# Altium integrated library WE_WR-MPC3_Micro Power Connector_3.00 mm_rev15c.IntLib: 173 symbols (part 1 of 2)
Pins are listed as number, name and electrical type; pins without a type are passive.

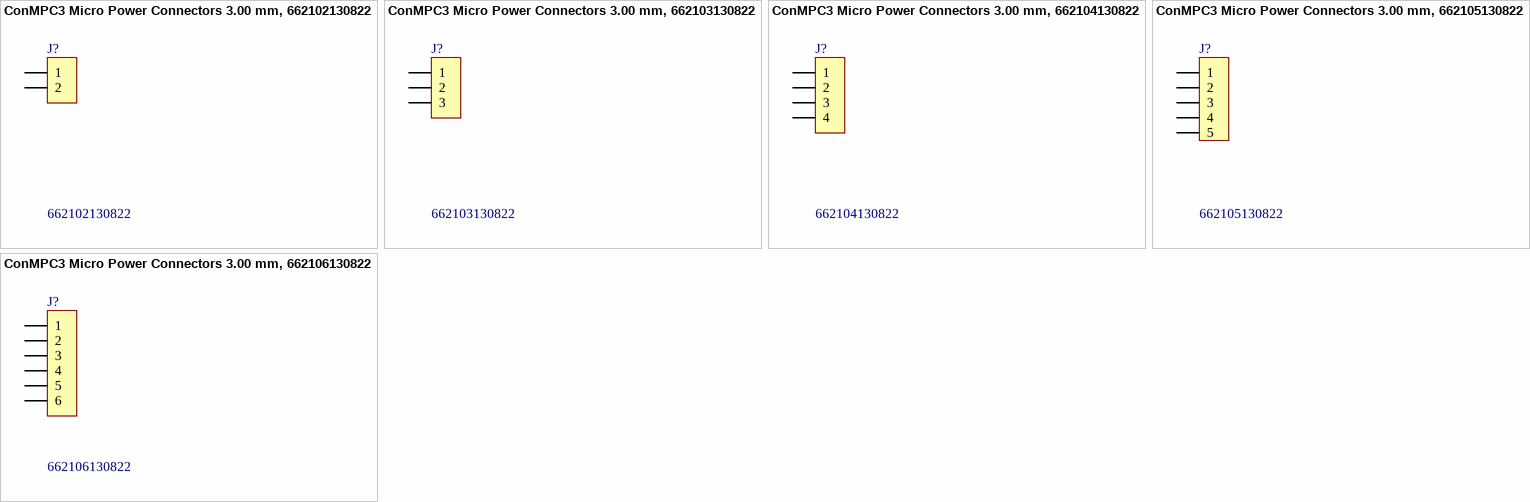
[diagram p0: symbols ConMPC3 Micro Power Connectors 3.00 mm, 662102130822 to ConMPC3 Micro Power Connectors 3.00 mm, 662106130822]

## ConMPC3 Micro Power Connectors 3.00 mm, 662102130822
designator J?, comment 662102130822
SMT Single Row Male Right Angled Header with Through Hole Retention Clips, 2 pins - Tape & Reel; Manufacturer: Wurth Elektronik; ComponentLink1 Description: Manufacturer; ComponentLink2 Description: Datasheet; NoPins: 2; Created Date: 27.Oct.2015; partNo: 662102130822; ComponentLink1URL: http://www.we-online.com; Created by: Baojun Chen
footprint 662102130822 (ConMPC3 Micro Power Connectors 3.00 mm _ 2 pins)
pins: 1, 2

## ConMPC3 Micro Power Connectors 3.00 mm, 662103130822
designator J?, comment 662103130822
SMT Single Row Male Right Angled Header with Through Hole Retention Clips, 3 pins - Tape & Reel; Manufacturer: Wurth Elektronik; ComponentLink1 Description: Manufacturer; ComponentLink2 Description: Datasheet; NoPins: 3; Created Date: 27.Oct.2015; partNo: 662103130822; ComponentLink1URL: http://www.we-online.com; Created by: Baojun Chen
footprint 662103130822 (ConMPC3 Micro Power Connectors 3.00 mm _ 3 pins)
pins: 1, 2, 3

## ConMPC3 Micro Power Connectors 3.00 mm, 662104130822
designator J?, comment 662104130822
SMT Single Row Male Right Angled Header with Through Hole Retention Clips, 4 pins - Tape & Reel; Manufacturer: Wurth Elektronik; ComponentLink1 Description: Manufacturer; ComponentLink2 Description: Datasheet; NoPins: 4; Created Date: 27.Oct.2015; partNo: 662104130822; ComponentLink1URL: http://www.we-online.com; Created by: Baojun Chen
footprint 662104130822 (ConMPC3 Micro Power Connectors 3.00 mm _ 4 pins)
pins: 1, 2, 3, 4

## ConMPC3 Micro Power Connectors 3.00 mm, 662105130822
designator J?, comment 662105130822
SMT Single Row Male Right Angled Header with Through Hole Retention Clips, 5 pins - Tape & Reel; Manufacturer: Wurth Elektronik; ComponentLink1 Description: Manufacturer; ComponentLink2 Description: Datasheet; NoPins: 5; Created Date: 27.Oct.2015; partNo: 662105130822; ComponentLink1URL: http://www.we-online.com; Created by: Baojun Chen
footprint 662105130822 (ConMPC3 Micro Power Connectors 3.00 mm _ 5 pins)
pins: 1, 2, 3, 4, 5

## ConMPC3 Micro Power Connectors 3.00 mm, 662106130822
designator J?, comment 662106130822
SMT Single Row Male Right Angled Header with Through Hole Retention Clips, 6 pins - Tape & Reel; Manufacturer: Wurth Elektronik; ComponentLink1 Description: Manufacturer; ComponentLink2 Description: Datasheet; NoPins: 6; Created Date: 27.Oct.2015; partNo: 662106130822; ComponentLink1URL: http://www.we-online.com; Created by: Baojun Chen
footprint 662106130822 (ConMPC3 Micro Power Connectors 3.00 mm _ 6 pins)
pins: 1, 2, 3, 4, 5, 6


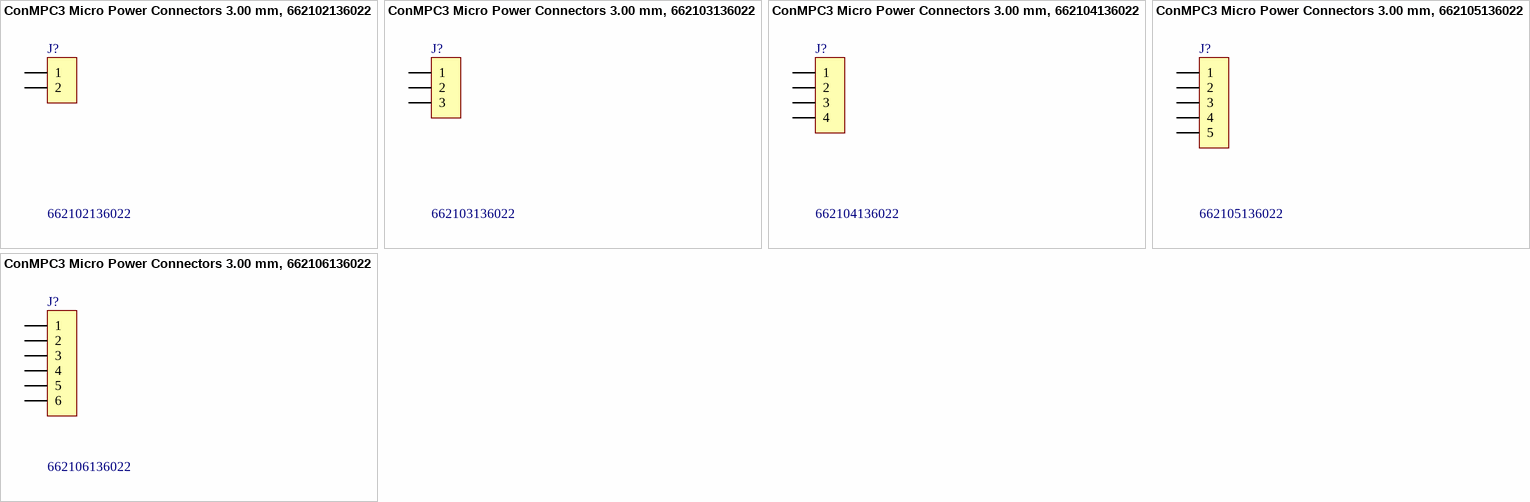
[diagram p1: symbols ConMPC3 Micro Power Connectors 3.00 mm, 662102136022 to ConMPC3 Micro Power Connectors 3.00 mm, 662106136022]

## ConMPC3 Micro Power Connectors 3.00 mm, 662102136022
designator J?, comment 662102136022
SMT Single Row Male Right Angled Header with Snap-in Plastic Pegs, 2 pins - Tape & Reel; Manufacturer: Wurth Elektronik; ComponentLink1 Description: Manufacturer; ComponentLink2 Description: Datasheet; NoPins: 2; Created Date: 27.Oct.2015; partNo: 662102136022; ComponentLink1URL: http://www.we-online.com; Created by: Baojun Chen
footprint 662102136022 (ConMPC3 Micro Power Connectors 3.00 mm _ 2 pins)
pins: 1, 2

## ConMPC3 Micro Power Connectors 3.00 mm, 662103136022
designator J?, comment 662103136022
SMT Single Row Male Right Angled Header with Snap-in Plastic Pegs, 3 pins - Tape & Reel; Manufacturer: Wurth Elektronik; ComponentLink1 Description: Manufacturer; ComponentLink2 Description: Datasheet; NoPins: 3; Created Date: 27.Oct.2015; partNo: 662103136022; ComponentLink1URL: http://www.we-online.com; Created by: Baojun Chen
footprint 662103136022 (ConMPC3 Micro Power Connectors 3.00 mm _ 3 pins)
pins: 1, 2, 3

## ConMPC3 Micro Power Connectors 3.00 mm, 662104136022
designator J?, comment 662104136022
SMT Single Row Male Right Angled Header with Snap-in Plastic Pegs, 4 pins - Tape & Reel; Manufacturer: Wurth Elektronik; ComponentLink1 Description: Manufacturer; ComponentLink2 Description: Datasheet; NoPins: 4; Created Date: 27.Oct.2015; partNo: 662104136022; ComponentLink1URL: http://www.we-online.com; Created by: Baojun Chen
footprint 662104136022 (ConMPC3 Micro Power Connectors 3.00 mm _ 4 pins)
pins: 1, 2, 3, 4

## ConMPC3 Micro Power Connectors 3.00 mm, 662105136022
designator J?, comment 662105136022
SMT Single Row Male Right Angled Header with Snap-in Plastic Pegs, 5 pins - Tape & Reel; Manufacturer: Wurth Elektronik; ComponentLink1 Description: Manufacturer; ComponentLink2 Description: Datasheet; NoPins: 5; Created Date: 27.Oct.2015; partNo: 662105136022; ComponentLink1URL: http://www.we-online.com; Created by: Baojun Chen
footprint 662105136022 (ConMPC3 Micro Power Connectors 3.00 mm _ 5 pins)
pins: 1, 2, 3, 4, 5

## ConMPC3 Micro Power Connectors 3.00 mm, 662106136022
designator J?, comment 662106136022
SMT Single Row Male Right Angled Header with Snap-in Plastic Pegs, 6 pins - Tape & Reel; Manufacturer: Wurth Elektronik; ComponentLink1 Description: Manufacturer; ComponentLink2 Description: Datasheet; NoPins: 6; Created Date: 27.Oct.2015; partNo: 662106136022; ComponentLink1URL: http://www.we-online.com; Created by: Baojun Chen
footprint 662106136022 (ConMPC3 Micro Power Connectors 3.00 mm _ 6 pins)
pins: 1, 2, 3, 4, 5, 6


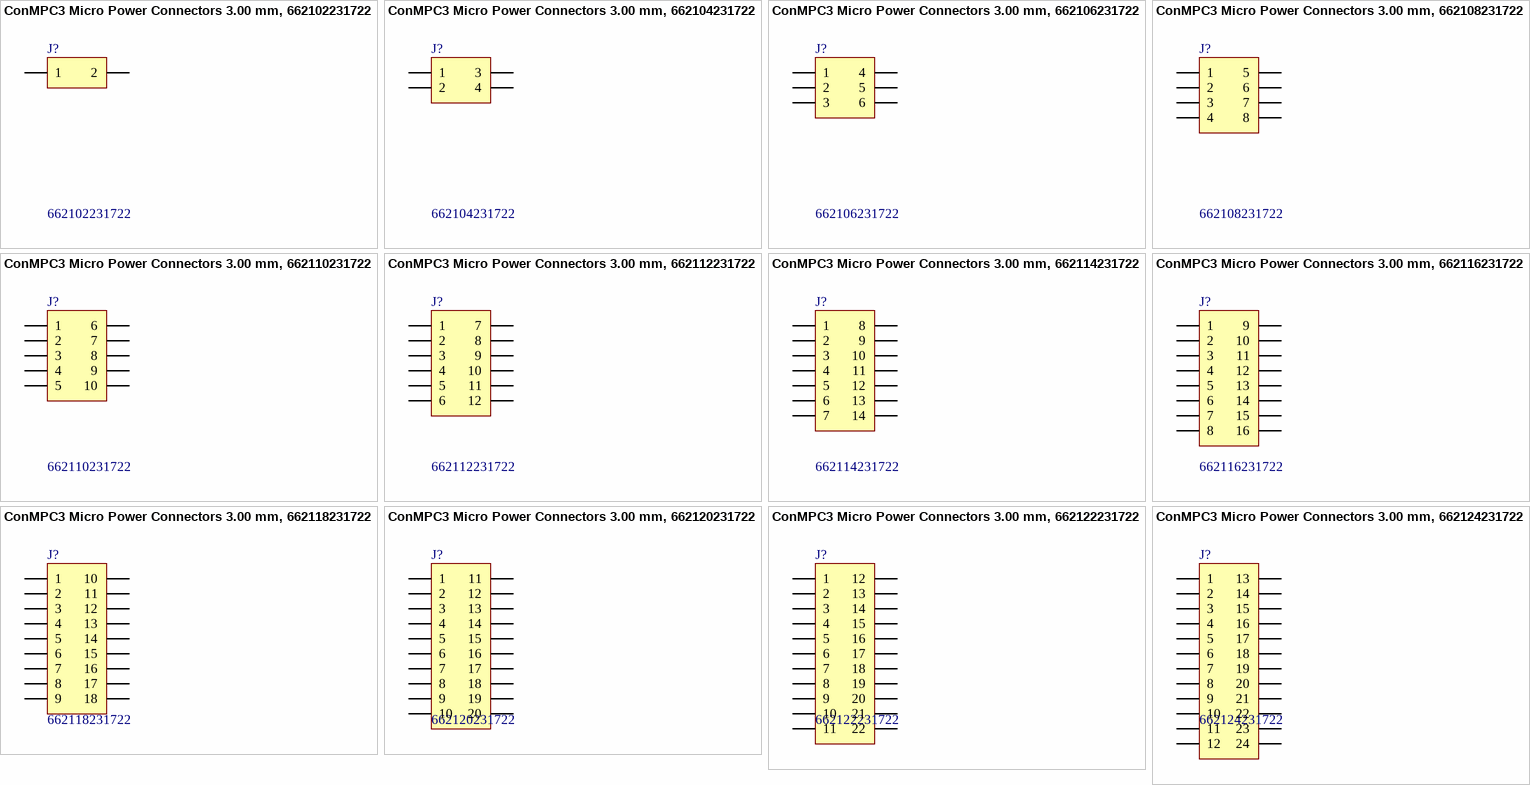
[diagram p2: symbols ConMPC3 Micro Power Connectors 3.00 mm, 662102231722 to ConMPC3 Micro Power Connectors 3.00 mm, 662124231722]

## ConMPC3 Micro Power Connectors 3.00 mm, 662102231722
designator J?, comment 662102231722
WR-MPC3 SMT Dual Row Male Right Angled Header, 2 pins; Manufacturer: Wurth Elektronik; ComponentLink1 Description: Manufacturer; ComponentLink2 Description: Datasheet; NoPins: 2; Created Date: Dec.2015; partNo: 662102231722; ComponentLink1URL: http://www.we-online.com; ComponentLink2URL: http://katalog.we-online.de/em/datasheet/6621xx231722.pdf; Created by: Baojun Chen
footprint 662102231722 (WR-MPC3,SMT Dual Row Male Right Angled Header,2 pins)
pins: 1, 2

## ConMPC3 Micro Power Connectors 3.00 mm, 662104231722
designator J?, comment 662104231722
WR-MPC3 SMT Dual Row Male Right Angled Header, 4 pins; Manufacturer: Wurth Elektronik; ComponentLink1 Description: Manufacturer; ComponentLink2 Description: Datasheet; NoPins: 4; Created Date: Dec.2015; partNo: 662104231722; ComponentLink1URL: http://www.we-online.com; ComponentLink2URL: http://katalog.we-online.de/em/datasheet/6621xx231722.pdf; Created by: Baojun Chen
footprint 662104231722 (WR-MPC3,SMT Dual Row Male Right Angled Header,4 pins)
pins: 1, 2, 3, 4

## ConMPC3 Micro Power Connectors 3.00 mm, 662106231722
designator J?, comment 662106231722
WR-MPC3 SMT Dual Row Male Right Angled Header, 6 pins; Manufacturer: Wurth Elektronik; ComponentLink1 Description: Manufacturer; ComponentLink2 Description: Datasheet; NoPins: 6; Created Date: Dec.2015; partNo: 662106231722; ComponentLink1URL: http://www.we-online.com; ComponentLink2URL: http://katalog.we-online.de/em/datasheet/6621xx231722.pdf; Created by: Baojun Chen
footprint 662106231722 (WR-MPC3,SMT Dual Row Male Right Angled Header,6 pins)
pins: 1, 2, 3, 4, 5, 6

## ConMPC3 Micro Power Connectors 3.00 mm, 662108231722
designator J?, comment 662108231722
WR-MPC3 SMT Dual Row Male Right Angled Header, 8 pins; Manufacturer: Wurth Elektronik; ComponentLink1 Description: Manufacturer; ComponentLink2 Description: Datasheet; NoPins: 8; Created Date: Dec.2015; partNo: 662108231722; ComponentLink1URL: http://www.we-online.com; ComponentLink2URL: http://katalog.we-online.de/em/datasheet/6621xx231722.pdf; Created by: Baojun Chen
footprint 662108231722 (WR-MPC3,SMT Dual Row Male Right Angled Header,8 pins)
pins: 1, 2, 3, 4, 5, 6, 7, 8

## ConMPC3 Micro Power Connectors 3.00 mm, 662110231722
designator J?, comment 662110231722
WR-MPC3 SMT Dual Row Male Right Angled Header, 10 pins; Manufacturer: Wurth Elektronik; ComponentLink1 Description: Manufacturer; ComponentLink2 Description: Datasheet; NoPins: 10; Created Date: Dec.2015; partNo: 662110231722; ComponentLink1URL: http://www.we-online.com; ComponentLink2URL: http://katalog.we-online.de/em/datasheet/6621xx231722.pdf; Created by: Baojun Chen
footprint 662110231722 (WR-MPC3,SMT Dual Row Male Right Angled Header,10 pins)
pins: 1, 2, 3, 4, 5, 6, 7, 8, 9, 10

## ConMPC3 Micro Power Connectors 3.00 mm, 662112231722
designator J?, comment 662112231722
WR-MPC3 SMT Dual Row Male Right Angled Header, 12 pins; Manufacturer: Wurth Elektronik; ComponentLink1 Description: Manufacturer; ComponentLink2 Description: Datasheet; NoPins: 12; Created Date: Dec.2015; partNo: 662112231722; ComponentLink1URL: http://www.we-online.com; ComponentLink2URL: http://katalog.we-online.de/em/datasheet/6621xx231722.pdf; Created by: Baojun Chen
footprint 662112231722 (WR-MPC3,SMT Dual Row Male Right Angled Header,12 pins)
pins: 1, 2, 3, 4, 5, 6, 7, 8, 9, 10, 11, 12

## ConMPC3 Micro Power Connectors 3.00 mm, 662114231722
designator J?, comment 662114231722
WR-MPC3 SMT Dual Row Male Right Angled Header, 14 pins; Manufacturer: Wurth Elektronik; ComponentLink1 Description: Manufacturer; ComponentLink2 Description: Datasheet; NoPins: 14; Created Date: Dec.2015; partNo: 662114231722; ComponentLink1URL: http://www.we-online.com; ComponentLink2URL: http://katalog.we-online.de/em/datasheet/6621xx231722.pdf; Created by: Baojun Chen
footprint 662114231722 (WR-MPC3,SMT Dual Row Male Right Angled Header,14 pins)
pins: 1, 2, 3, 4, 5, 6, 7, 8, 9, 10, 11, 12, 13, 14

## ConMPC3 Micro Power Connectors 3.00 mm, 662116231722
designator J?, comment 662116231722
WR-MPC3 SMT Dual Row Male Right Angled Header, 16 pins; Manufacturer: Wurth Elektronik; ComponentLink1 Description: Manufacturer; ComponentLink2 Description: Datasheet; NoPins: 16; Created Date: Dec.2015; partNo: 662116231722; ComponentLink1URL: http://www.we-online.com; ComponentLink2URL: http://katalog.we-online.de/em/datasheet/6621xx231722.pdf; Created by: Baojun Chen
footprint 662116231722 (WR-MPC3,SMT Dual Row Male Right Angled Header,16 pins)
pins: 1, 2, 3, 4, 5, 6, 7, 8, 9, 10, 11, 12, 13, 14, 15, 16

## ConMPC3 Micro Power Connectors 3.00 mm, 662118231722
designator J?, comment 662118231722
WR-MPC3 SMT Dual Row Male Right Angled Header, 18 pins; Manufacturer: Wurth Elektronik; ComponentLink1 Description: Manufacturer; ComponentLink2 Description: Datasheet; NoPins: 18; Created Date: Dec.2015; partNo: 662118231722; ComponentLink1URL: http://www.we-online.com; ComponentLink2URL: http://katalog.we-online.de/em/datasheet/6621xx231722.pdf; Created by: Baojun Chen
footprint 662118231722 (WR-MPC3,SMT Dual Row Male Right Angled Header,18 pins)
pins: 1, 2, 3, 4, 5, 6, 7, 8, 9, 10, 11, 12, 13, 14, 15, 16, 17, 18

## ConMPC3 Micro Power Connectors 3.00 mm, 662120231722
designator J?, comment 662120231722
WR-MPC3 SMT Dual Row Male Right Angled Header, 20 pins; Manufacturer: Wurth Elektronik; ComponentLink1 Description: Manufacturer; ComponentLink2 Description: Datasheet; NoPins: 20; Created Date: Dec.2015; partNo: 662120231722; ComponentLink1URL: http://www.we-online.com; ComponentLink2URL: http://katalog.we-online.de/em/datasheet/6621xx231722.pdf; Created by: Baojun Chen
footprint 662120231722 (WR-MPC3,SMT Dual Row Male Right Angled Header,20 pins)
pins: 1, 2, 3, 4, 5, 6, 7, 8, 9, 10, 11, 12, 13, 14, 15, 16, 17, 18, 19, 20

## ConMPC3 Micro Power Connectors 3.00 mm, 662122231722
designator J?, comment 662122231722
WR-MPC3 SMT Dual Row Male Right Angled Header, 22 pins; Manufacturer: Wurth Elektronik; ComponentLink1 Description: Manufacturer; ComponentLink2 Description: Datasheet; NoPins: 22; Created Date: Dec.2015; partNo: 662122231722; ComponentLink1URL: http://www.we-online.com; ComponentLink2URL: http://katalog.we-online.de/em/datasheet/6621xx231722.pdf; Created by: Baojun Chen
footprint 662122231722 (WR-MPC3,SMT Dual Row Male Right Angled Header,22 pins)
pins: 1, 2, 3, 4, 5, 6, 7, 8, 9, 10, 11, 12, 13, 14, 15, 16, 17, 18, 19, 20, 21, 22

## ConMPC3 Micro Power Connectors 3.00 mm, 662124231722
designator J?, comment 662124231722
WR-MPC3 SMT Dual Row Male Right Angled Header, 24 pins; Manufacturer: Wurth Elektronik; ComponentLink1 Description: Manufacturer; ComponentLink2 Description: Datasheet; NoPins: 24; Created Date: Dec.2015; partNo: 662124231722; ComponentLink1URL: http://www.we-online.com; ComponentLink2URL: http://katalog.we-online.de/em/datasheet/6621xx231722.pdf; Created by: Baojun Chen
footprint 662124231722 (WR-MPC3,SMT Dual Row Male Right Angled Header,24 pins)
pins: 1, 2, 3, 4, 5, 6, 7, 8, 9, 10, 11, 12, 13, 14, 15, 16, 17, 18, 19, 20, 21, 22, 23, 24


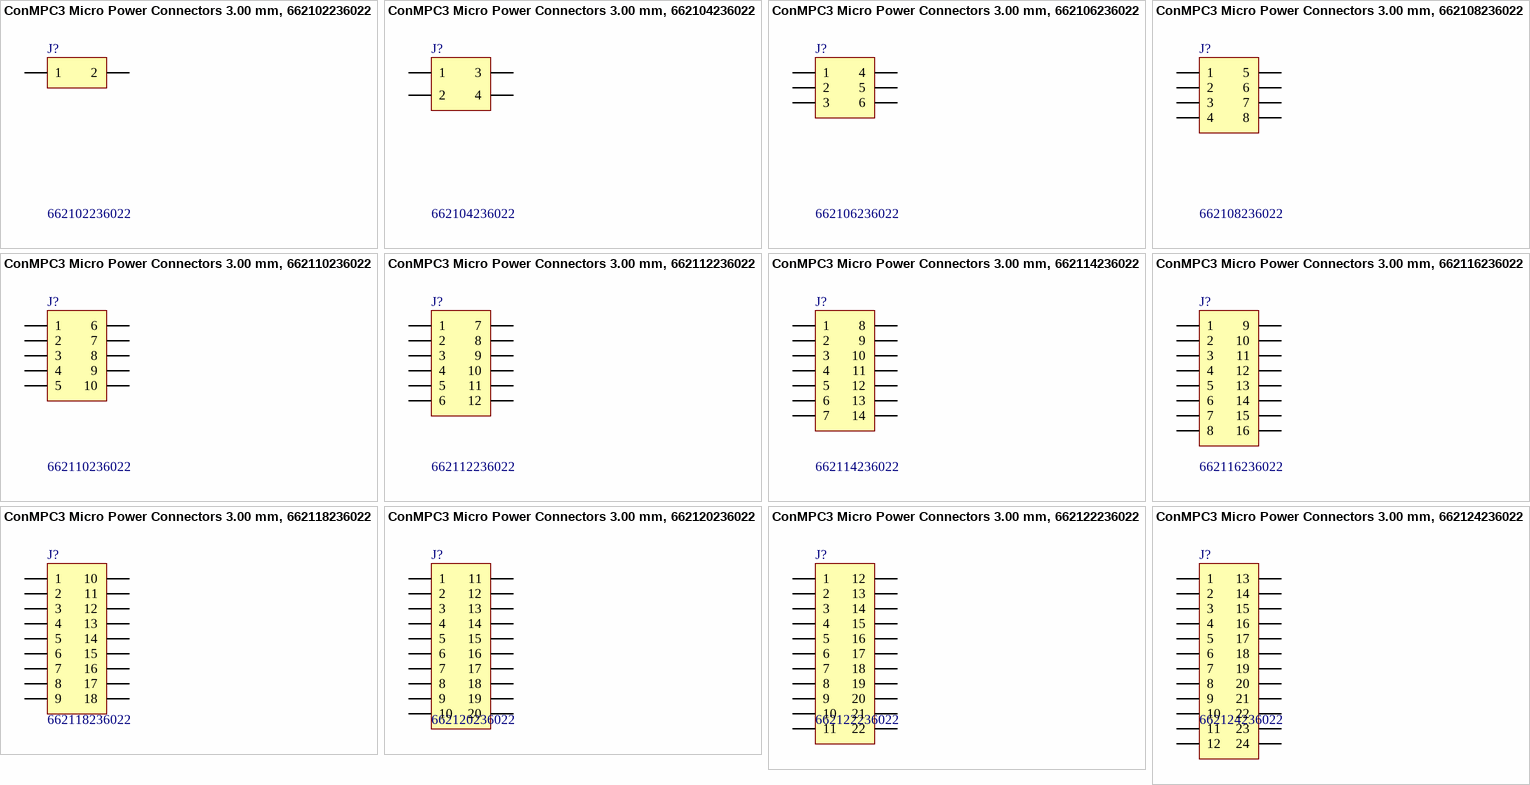
[diagram p3: symbols ConMPC3 Micro Power Connectors 3.00 mm, 662102236022 to ConMPC3 Micro Power Connectors 3.00 mm, 662124236022]

## ConMPC3 Micro Power Connectors 3.00 mm, 662102236022
designator J?, comment 662102236022
WR-MPC3 SMT Dual Row Male Right Angled Header, 2 pins; Manufacturer: Wurth Elektronik; ComponentLink1 Description: Manufacturer; ComponentLink2 Description: Datasheet; NoPins: 2; Created Date: Dec.2015; partNo: 662102236022; ComponentLink1URL: http://www.we-online.com; ComponentLink2URL: http://katalog.we-online.de/em/datasheet/6620xx236022.pdf; Created by: Baojun Chen
footprint 662102236022 (SMT Dual Row Male Right Angled Header, 2 pins)
pins: 1, 2

## ConMPC3 Micro Power Connectors 3.00 mm, 662104236022
designator J?, comment 662104236022
WR-MPC3 SMT Dual Row Male Right Angled Header, 4 pins; Manufacturer: Wurth Elektronik; ComponentLink1 Description: Manufacturer; ComponentLink2 Description: Datasheet; NoPins: 4; Created Date: Dec.2015; partNo: 662104236022; ComponentLink1URL: http://www.we-online.com; ComponentLink2URL: http://katalog.we-online.de/em/datasheet/6620xx236022.pdf; Created by: Baojun Chen
footprint 662104236022 (SMT Dual Row Male Right Angled Header, 4 pins)
pins: 1, 2, 3, 4

## ConMPC3 Micro Power Connectors 3.00 mm, 662106236022
designator J?, comment 662106236022
WR-MPC3 SMT Dual Row Male Right Angled Header, 6 pins; Manufacturer: Wurth Elektronik; ComponentLink1 Description: Manufacturer; ComponentLink2 Description: Datasheet; NoPins: 6; Created Date: Dec.2015; partNo: 662106236022; ComponentLink1URL: http://www.we-online.com; ComponentLink2URL: http://katalog.we-online.de/em/datasheet/6620xx236022.pdf; Created by: Baojun Chen
footprint 662106236022 (SMT Dual Row Male Right Angled Header, 6 pins)
pins: 1, 2, 3, 4, 5, 6

## ConMPC3 Micro Power Connectors 3.00 mm, 662108236022
designator J?, comment 662108236022
WR-MPC3 SMT Dual Row Male Right Angled Header, 8 pins; Manufacturer: Wurth Elektronik; ComponentLink1 Description: Manufacturer; ComponentLink2 Description: Datasheet; NoPins: 8; Created Date: Dec.2015; partNo: 662108236022; ComponentLink1URL: http://www.we-online.com; ComponentLink2URL: http://katalog.we-online.de/em/datasheet/6620xx236022.pdf; Created by: Baojun Chen
footprint 662108236022 (SMT Dual Row Male Right Angled Header, 8 pins)
pins: 1, 2, 3, 4, 5, 6, 7, 8

## ConMPC3 Micro Power Connectors 3.00 mm, 662110236022
designator J?, comment 662110236022
WR-MPC3 SMT Dual Row Male Right Angled Header, 10 pins; Manufacturer: Wurth Elektronik; ComponentLink1 Description: Manufacturer; ComponentLink2 Description: Datasheet; NoPins: 10; Created Date: Dec.2015; partNo: 662110236022; ComponentLink1URL: http://www.we-online.com; ComponentLink2URL: http://katalog.we-online.de/em/datasheet/6620xx236022.pdf; Created by: Baojun Chen
footprint 662110236022 (SMT Dual Row Male Right Angled Header, 10 pins)
pins: 1, 2, 3, 4, 5, 6, 7, 8, 9, 10

## ConMPC3 Micro Power Connectors 3.00 mm, 662112236022
designator J?, comment 662112236022
WR-MPC3 SMT Dual Row Male Right Angled Header, 12 pins; Manufacturer: Wurth Elektronik; ComponentLink1 Description: Manufacturer; ComponentLink2 Description: Datasheet; NoPins: 12; Created Date: Dec.2015; partNo: 662112236022; ComponentLink1URL: http://www.we-online.com; ComponentLink2URL: http://katalog.we-online.de/em/datasheet/6620xx236022.pdf; Created by: Baojun Chen
footprint 662112236022 (SMT Dual Row Male Right Angled Header, 12 pins)
pins: 1, 2, 3, 4, 5, 6, 7, 8, 9, 10, 11, 12

## ConMPC3 Micro Power Connectors 3.00 mm, 662114236022
designator J?, comment 662114236022
WR-MPC3 SMT Dual Row Male Right Angled Header, 14 pins; Manufacturer: Wurth Elektronik; ComponentLink1 Description: Manufacturer; ComponentLink2 Description: Datasheet; NoPins: 14; Created Date: Dec.2015; partNo: 662114236022; ComponentLink1URL: http://www.we-online.com; ComponentLink2URL: http://katalog.we-online.de/em/datasheet/6620xx236022.pdf; Created by: Baojun Chen
footprint 662114236022 (SMT Dual Row Male Right Angled Header, 14 pins)
pins: 1, 2, 3, 4, 5, 6, 7, 8, 9, 10, 11, 12, 13, 14

## ConMPC3 Micro Power Connectors 3.00 mm, 662116236022
designator J?, comment 662116236022
WR-MPC3 SMT Dual Row Male Right Angled Header, 16 pins; Manufacturer: Wurth Elektronik; ComponentLink1 Description: Manufacturer; ComponentLink2 Description: Datasheet; NoPins: 16; Created Date: Dec.2015; partNo: 662116236022; ComponentLink1URL: http://www.we-online.com; ComponentLink2URL: http://katalog.we-online.de/em/datasheet/6620xx236022.pdf; Created by: Baojun Chen
footprint 662116236022 (SMT Dual Row Male Right Angled Header, 16 pins)
pins: 1, 2, 3, 4, 5, 6, 7, 8, 9, 10, 11, 12, 13, 14, 15, 16

## ConMPC3 Micro Power Connectors 3.00 mm, 662118236022
designator J?, comment 662118236022
WR-MPC3 SMT Dual Row Male Right Angled Header, 18 pins; Manufacturer: Wurth Elektronik; ComponentLink1 Description: Manufacturer; ComponentLink2 Description: Datasheet; NoPins: 18; Created Date: Dec.2015; partNo: 662118236022; ComponentLink1URL: http://www.we-online.com; ComponentLink2URL: http://katalog.we-online.de/em/datasheet/6620xx236022.pdf; Created by: Baojun Chen
footprint 662118236022 (SMT Dual Row Male Right Angled Header, 18 pins)
pins: 1, 2, 3, 4, 5, 6, 7, 8, 9, 10, 11, 12, 13, 14, 15, 16, 17, 18

## ConMPC3 Micro Power Connectors 3.00 mm, 662120236022
designator J?, comment 662120236022
WR-MPC3 SMT Dual Row Male Right Angled Header, 20 pins; Manufacturer: Wurth Elektronik; ComponentLink1 Description: Manufacturer; ComponentLink2 Description: Datasheet; NoPins: 20; Created Date: Dec.2015; partNo: 662120236022; ComponentLink1URL: http://www.we-online.com; ComponentLink2URL: http://katalog.we-online.de/em/datasheet/6620xx236022.pdf; Created by: Baojun Chen
footprint 662120236022 (SMT Dual Row Male Right Angled Header, 20 pins)
pins: 1, 2, 3, 4, 5, 6, 7, 8, 9, 10, 11, 12, 13, 14, 15, 16, 17, 18, 19, 20

## ConMPC3 Micro Power Connectors 3.00 mm, 662122236022
designator J?, comment 662122236022
WR-MPC3 SMT Dual Row Male Right Angled Header, 22 pins; Manufacturer: Wurth Elektronik; ComponentLink1 Description: Manufacturer; ComponentLink2 Description: Datasheet; NoPins: 22; Created Date: Dec.2015; partNo: 662122236022; ComponentLink1URL: http://www.we-online.com; ComponentLink2URL: http://katalog.we-online.de/em/datasheet/6620xx236022.pdf; Created by: Baojun Chen
footprint 662122236022 (SMT Dual Row Male Right Angled Header, 22 pins)
pins: 1, 2, 3, 4, 5, 6, 7, 8, 9, 10, 11, 12, 13, 14, 15, 16, 17, 18, 19, 20, 21, 22

## ConMPC3 Micro Power Connectors 3.00 mm, 662124236022
designator J?, comment 662124236022
WR-MPC3 SMT Dual Row Male Right Angled Header, 24 pins; Manufacturer: Wurth Elektronik; ComponentLink1 Description: Manufacturer; ComponentLink2 Description: Datasheet; NoPins: 24; Created Date: Dec.2015; partNo: 662124236022; ComponentLink1URL: http://www.we-online.com; ComponentLink2URL: http://katalog.we-online.de/em/datasheet/6620xx236022.pdf; Created by: Baojun Chen
footprint 662124236022 (SMT Dual Row Male Right Angled Header, 24 pins)
pins: 1, 2, 3, 4, 5, 6, 7, 8, 9, 10, 11, 12, 13, 14, 15, 16, 17, 18, 19, 20, 21, 22, 23, 24


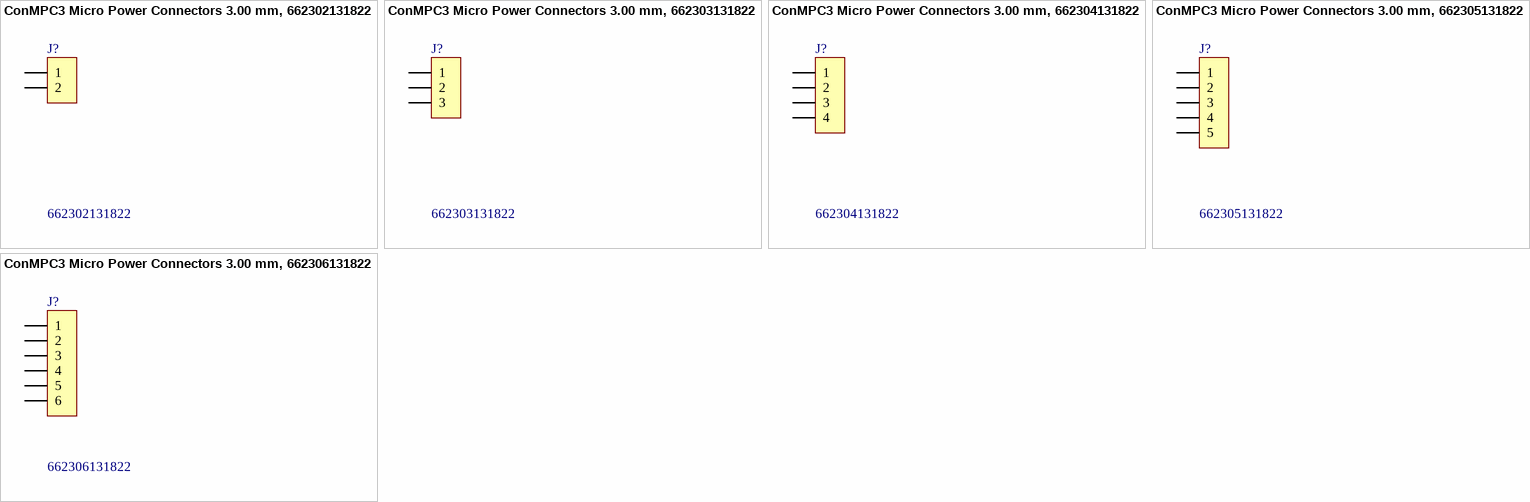
[diagram p4: symbols ConMPC3 Micro Power Connectors 3.00 mm, 662302131822 to ConMPC3 Micro Power Connectors 3.00 mm, 662306131822]

## ConMPC3 Micro Power Connectors 3.00 mm, 662302131822
designator J?, comment 662302131822
SMT Single Row Male Vertical Header with SMT Solder Tabs, 2 pins - Tape & Reel with Cap; Manufacturer: Wurth Elektronik; ComponentLink1 Description: Manufacturer; ComponentLink2 Description: Datasheet; NoPins: 2; Created Date: 27.Oct.2015; partNo: 662302131822; ComponentLink1URL: http://www.we-online.com; Created by: Baojun Chen
footprint 662302131822 (ConMPC3 Micro Power Connectors 3.00 mm _ 2 pins)
pins: 1, 2

## ConMPC3 Micro Power Connectors 3.00 mm, 662303131822
designator J?, comment 662303131822
SMT Single Row Male Vertical Header with SMT Solder Tabs, 3 pins - Tape & Reel with Cap; Manufacturer: Wurth Elektronik; ComponentLink1 Description: Manufacturer; ComponentLink2 Description: Datasheet; NoPins: 3; Created Date: 27.Oct.2015; partNo: 662303131822; ComponentLink1URL: http://www.we-online.com; Created by: Baojun Chen
footprint 662303131822 (ConMPC3 Micro Power Connectors 3.00 mm _ 3 pins)
pins: 1, 2, 3

## ConMPC3 Micro Power Connectors 3.00 mm, 662304131822
designator J?, comment 662304131822
SMT Single Row Male Vertical Header with SMT Solder Tabs, 4 pins - Tape & Reel with Cap; Manufacturer: Wurth Elektronik; ComponentLink1 Description: Manufacturer; ComponentLink2 Description: Datasheet; NoPins: 4; Created Date: 27.Oct.2015; partNo: 662304131822; ComponentLink1URL: http://www.we-online.com; Created by: Baojun Chen
footprint 662304131822 (ConMPC3 Micro Power Connectors 3.00 mm _ 4 pins)
pins: 1, 2, 3, 4

## ConMPC3 Micro Power Connectors 3.00 mm, 662305131822
designator J?, comment 662305131822
SMT Single Row Male Vertical Header with SMT Solder Tabs, 5 pins - Tape & Reel with Cap; Manufacturer: Wurth Elektronik; ComponentLink1 Description: Manufacturer; ComponentLink2 Description: Datasheet; NoPins: 5; Created Date: 27.Oct.2015; partNo: 662305131822; ComponentLink1URL: http://www.we-online.com; Created by: Baojun Chen
footprint 662305131822 (ConMPC3 Micro Power Connectors 3.00 mm _ 5 pins)
pins: 1, 2, 3, 4, 5

## ConMPC3 Micro Power Connectors 3.00 mm, 662306131822
designator J?, comment 662306131822
SMT Single Row Male Vertical Header with SMT Solder Tabs, 6 pins - Tape & Reel with Cap; Manufacturer: Wurth Elektronik; ComponentLink1 Description: Manufacturer; ComponentLink2 Description: Datasheet; NoPins: 6; Created Date: 27.Oct.2015; partNo: 662306131822; ComponentLink1URL: http://www.we-online.com; Created by: Baojun Chen
footprint 662306131822 (ConMPC3 Micro Power Connectors 3.00 mm _ 6 pins)
pins: 1, 2, 3, 4, 5, 6


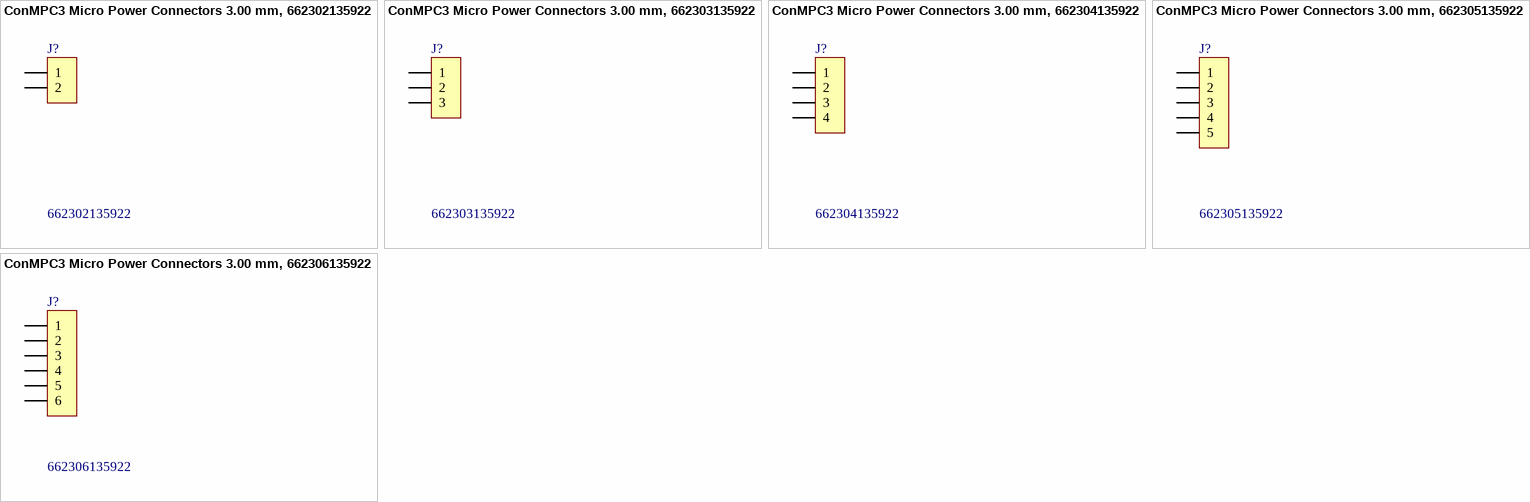
[diagram p5: symbols ConMPC3 Micro Power Connectors 3.00 mm, 662302135922 to ConMPC3 Micro Power Connectors 3.00 mm, 662306135922]

## ConMPC3 Micro Power Connectors 3.00 mm, 662302135922
designator J?, comment 662302135922
SMT Single Row Male Vertical Header with Through Hole Retention Clips, 2 pins - Tape & Reel with Cap; Manufacturer: Wurth Elektronik; ComponentLink1 Description: Manufacturer; ComponentLink2 Description: Datasheet; NoPins: 2; Created Date: 27.Oct.2015; partNo: 662302135922; ComponentLink1URL: http://www.we-online.com; Created by: Baojun Chen
footprint 662302135922 (ConMPC3 Micro Power Connectors 3.00 mm _ 2 pins)
pins: 1, 2

## ConMPC3 Micro Power Connectors 3.00 mm, 662303135922
designator J?, comment 662303135922
SMT Single Row Male Vertical Header with Through Hole Retention Clips, 3 pins - Tape & Reel with Cap; Manufacturer: Wurth Elektronik; ComponentLink1 Description: Manufacturer; ComponentLink2 Description: Datasheet; NoPins: 3; Created Date: 27.Oct.2015; partNo: 662303135922; ComponentLink1URL: http://www.we-online.com; Created by: Baojun Chen
footprint 662303135922 (ConMPC3 Micro Power Connectors 3.00 mm _ 3 pins)
pins: 1, 2, 3

## ConMPC3 Micro Power Connectors 3.00 mm, 662304135922
designator J?, comment 662304135922
SMT Single Row Male Vertical Header with Through Hole Retention Clips, 4 pins - Tape & Reel with Cap; Manufacturer: Wurth Elektronik; ComponentLink1 Description: Manufacturer; ComponentLink2 Description: Datasheet; NoPins: 4; Created Date: 27.Oct.2015; partNo: 662304135922; ComponentLink1URL: http://www.we-online.com; Created by: Baojun Chen
footprint 662304135922 (ConMPC3 Micro Power Connectors 3.00 mm _ 4 pins)
pins: 1, 2, 3, 4

## ConMPC3 Micro Power Connectors 3.00 mm, 662305135922
designator J?, comment 662305135922
SMT Single Row Male Vertical Header with Through Hole Retention Clips, 5 pins - Tape & Reel with Cap; Manufacturer: Wurth Elektronik; ComponentLink1 Description: Manufacturer; ComponentLink2 Description: Datasheet; NoPins: 5; Created Date: 27.Oct.2015; partNo: 662305135922; ComponentLink1URL: http://www.we-online.com; Created by: Baojun Chen
footprint 662305135922 (ConMPC3 Micro Power Connectors 3.00 mm _ 5 pins)
pins: 1, 2, 3, 4, 5

## ConMPC3 Micro Power Connectors 3.00 mm, 662306135922
designator J?, comment 662306135922
SMT Single Row Male Vertical Header with Through Hole Retention Clips, 6 pins - Tape & Reel with Cap; Manufacturer: Wurth Elektronik; ComponentLink1 Description: Manufacturer; ComponentLink2 Description: Datasheet; NoPins: 6; Created Date: 27.Oct.2015; partNo: 662306135922; ComponentLink1URL: http://www.we-online.com; Created by: Baojun Chen
footprint 662306135922 (ConMPC3 Micro Power Connectors 3.00 mm _ 6 pins)
pins: 1, 2, 3, 4, 5, 6


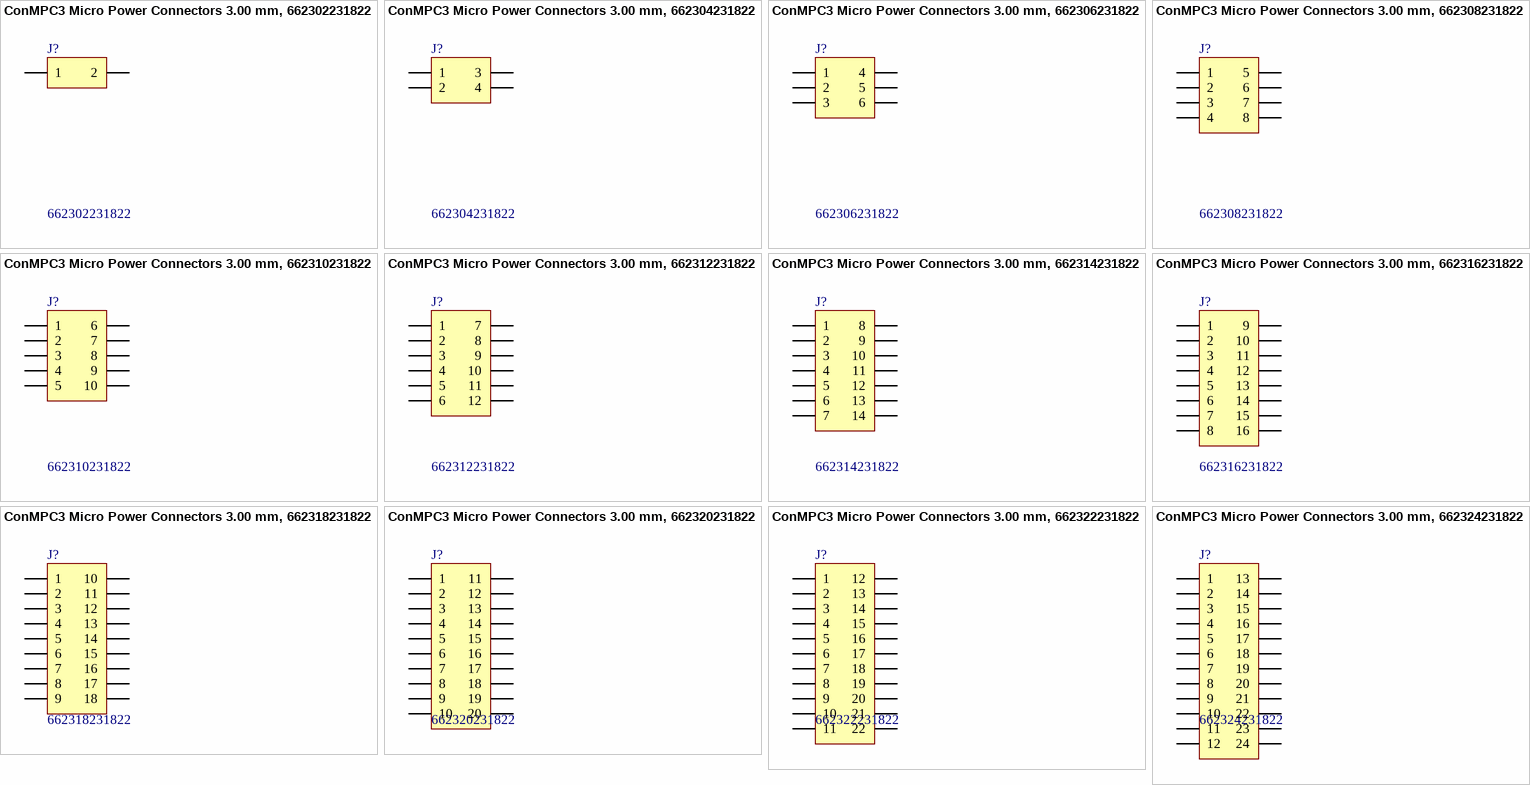
[diagram p6: symbols ConMPC3 Micro Power Connectors 3.00 mm, 662302231822 to ConMPC3 Micro Power Connectors 3.00 mm, 662324231822]

## ConMPC3 Micro Power Connectors 3.00 mm, 662302231822
designator J?, comment 662302231822
WR-MPC3 SMT Dual Row Male Vertical Header, 2 pins; Manufacturer: Wurth Elektronik; ComponentLink1 Description: Manufacturer; ComponentLink2 Description: Datasheet; NoPins: 2; Created Date: Dec.2015; partNo: 662302231822; ComponentLink1URL: http://www.we-online.com; ComponentLink2URL: http://katalog.we-online.de/em/datasheet/6620xx231822.pdf; Created by: Baojun Chen
footprint 662302231822 (SMT Dual Row Male Vertical Header, 2 pins)
pins: 1, 2

## ConMPC3 Micro Power Connectors 3.00 mm, 662304231822
designator J?, comment 662304231822
WR-MPC3 SMT Dual Row Male Vertical Header, 4 pins; Manufacturer: Wurth Elektronik; ComponentLink1 Description: Manufacturer; ComponentLink2 Description: Datasheet; NoPins: 4; Created Date: Dec.2015; partNo: 662304231822; ComponentLink1URL: http://www.we-online.com; ComponentLink2URL: http://katalog.we-online.de/em/datasheet/6620xx231822.pdf; Created by: Baojun Chen
footprint 662304231822 (SMT Dual Row Male Vertical Header, 4 pins)
pins: 1, 2, 3, 4

## ConMPC3 Micro Power Connectors 3.00 mm, 662306231822
designator J?, comment 662306231822
WR-MPC3 SMT Dual Row Male Vertical Header, 6 pins; Manufacturer: Wurth Elektronik; ComponentLink1 Description: Manufacturer; ComponentLink2 Description: Datasheet; NoPins: 6; Created Date: Dec.2015; partNo: 662306231822; ComponentLink1URL: http://www.we-online.com; ComponentLink2URL: http://katalog.we-online.de/em/datasheet/6620xx231822.pdf; Created by: Baojun Chen
footprint 662306231822 (SMT Dual Row Male Vertical Header, 6 pins)
pins: 1, 2, 3, 4, 5, 6

## ConMPC3 Micro Power Connectors 3.00 mm, 662308231822
designator J?, comment 662308231822
WR-MPC3 SMT Dual Row Male Vertical Header, 8 pins; Manufacturer: Wurth Elektronik; ComponentLink1 Description: Manufacturer; ComponentLink2 Description: Datasheet; NoPins: 8; Created Date: Dec.2015; partNo: 662308231822; ComponentLink1URL: http://www.we-online.com; ComponentLink2URL: http://katalog.we-online.de/em/datasheet/6620xx231822.pdf; Created by: Baojun Chen
footprint 662308231822 (SMT Dual Row Male Vertical Header, 8 pins)
pins: 1, 2, 3, 4, 5, 6, 7, 8

## ConMPC3 Micro Power Connectors 3.00 mm, 662310231822
designator J?, comment 662310231822
WR-MPC3 SMT Dual Row Male Vertical Header, 10 pins; Manufacturer: Wurth Elektronik; ComponentLink1 Description: Manufacturer; ComponentLink2 Description: Datasheet; NoPins: 10; Created Date: Dec.2015; partNo: 662310231822; ComponentLink1URL: http://www.we-online.com; ComponentLink2URL: http://katalog.we-online.de/em/datasheet/6620xx231822.pdf; Created by: Baojun Chen
footprint 662310231822 (SMT Dual Row Male Vertical Header, 10 pins)
pins: 1, 2, 3, 4, 5, 6, 7, 8, 9, 10

## ConMPC3 Micro Power Connectors 3.00 mm, 662312231822
designator J?, comment 662312231822
WR-MPC3 SMT Dual Row Male Vertical Header, 12 pins; Manufacturer: Wurth Elektronik; ComponentLink1 Description: Manufacturer; ComponentLink2 Description: Datasheet; NoPins: 12; Created Date: Dec.2015; partNo: 662312231822; ComponentLink1URL: http://www.we-online.com; ComponentLink2URL: http://katalog.we-online.de/em/datasheet/6620xx231822.pdf; Created by: Baojun Chen
footprint 662312231822 (SMT Dual Row Male Vertical Header, 12 pins)
pins: 1, 2, 3, 4, 5, 6, 7, 8, 9, 10, 11, 12

## ConMPC3 Micro Power Connectors 3.00 mm, 662314231822
designator J?, comment 662314231822
WR-MPC3 SMT Dual Row Male Vertical Header, 14 pins; Manufacturer: Wurth Elektronik; ComponentLink1 Description: Manufacturer; ComponentLink2 Description: Datasheet; NoPins: 14; Created Date: Dec.2015; partNo: 662314231822; ComponentLink1URL: http://www.we-online.com; ComponentLink2URL: http://katalog.we-online.de/em/datasheet/6620xx231822.pdf; Created by: Baojun Chen
footprint 662314231822 (SMT Dual Row Male Vertical Header, 14 pins)
pins: 1, 2, 3, 4, 5, 6, 7, 8, 9, 10, 11, 12, 13, 14

## ConMPC3 Micro Power Connectors 3.00 mm, 662316231822
designator J?, comment 662316231822
WR-MPC3 SMT Dual Row Male Vertical Header, 16 pins; Manufacturer: Wurth Elektronik; ComponentLink1 Description: Manufacturer; ComponentLink2 Description: Datasheet; NoPins: 16; Created Date: Dec.2015; partNo: 662316231822; ComponentLink1URL: http://www.we-online.com; ComponentLink2URL: http://katalog.we-online.de/em/datasheet/6620xx231822.pdf; Created by: Baojun Chen
footprint 662316231822 (SMT Dual Row Male Vertical Header, 16 pins)
pins: 1, 2, 3, 4, 5, 6, 7, 8, 9, 10, 11, 12, 13, 14, 15, 16

## ConMPC3 Micro Power Connectors 3.00 mm, 662318231822
designator J?, comment 662318231822
WR-MPC3 SMT Dual Row Male Vertical Header, 18 pins; Manufacturer: Wurth Elektronik; ComponentLink1 Description: Manufacturer; ComponentLink2 Description: Datasheet; NoPins: 18; Created Date: Dec.2015; partNo: 662318231822; ComponentLink1URL: http://www.we-online.com; ComponentLink2URL: http://katalog.we-online.de/em/datasheet/6620xx231822.pdf; Created by: Baojun Chen
footprint 662318231822 (SMT Dual Row Male Vertical Header, 18 pins)
pins: 1, 2, 3, 4, 5, 6, 7, 8, 9, 10, 11, 12, 13, 14, 15, 16, 17, 18

## ConMPC3 Micro Power Connectors 3.00 mm, 662320231822
designator J?, comment 662320231822
WR-MPC3 SMT Dual Row Male Vertical Header, 20 pins; Manufacturer: Wurth Elektronik; ComponentLink1 Description: Manufacturer; ComponentLink2 Description: Datasheet; NoPins: 20; Created Date: Dec.2015; partNo: 662320231822; ComponentLink1URL: http://www.we-online.com; ComponentLink2URL: http://katalog.we-online.de/em/datasheet/6620xx231822.pdf; Created by: Baojun Chen
footprint 662320231822 (SMT Dual Row Male Vertical Header, 20 pins)
pins: 1, 2, 3, 4, 5, 6, 7, 8, 9, 10, 11, 12, 13, 14, 15, 16, 17, 18, 19, 20

## ConMPC3 Micro Power Connectors 3.00 mm, 662322231822
designator J?, comment 662322231822
WR-MPC3 SMT Dual Row Male Vertical Header, 22 pins; Manufacturer: Wurth Elektronik; ComponentLink1 Description: Manufacturer; ComponentLink2 Description: Datasheet; NoPins: 22; Created Date: Dec.2015; partNo: 662322231822; ComponentLink1URL: http://www.we-online.com; ComponentLink2URL: http://katalog.we-online.de/em/datasheet/6620xx231822.pdf; Created by: Baojun Chen
footprint 662322231822 (SMT Dual Row Male Vertical Header, 22 pins)
pins: 1, 2, 3, 4, 5, 6, 7, 8, 9, 10, 11, 12, 13, 14, 15, 16, 17, 18, 19, 20, 21, 22

## ConMPC3 Micro Power Connectors 3.00 mm, 662324231822
designator J?, comment 662324231822
WR-MPC3 SMT Dual Row Male Vertical Header, 24 pins; Manufacturer: Wurth Elektronik; ComponentLink1 Description: Manufacturer; ComponentLink2 Description: Datasheet; NoPins: 24; Created Date: Dec.2015; partNo: 662324231822; ComponentLink1URL: http://www.we-online.com; ComponentLink2URL: http://katalog.we-online.de/em/datasheet/6620xx231822.pdf; Created by: Baojun Chen
footprint 662324231822 (SMT Dual Row Male Vertical Header, 24 pins)
pins: 1, 2, 3, 4, 5, 6, 7, 8, 9, 10, 11, 12, 13, 14, 15, 16, 17, 18, 19, 20, 21, 22, 23, 24


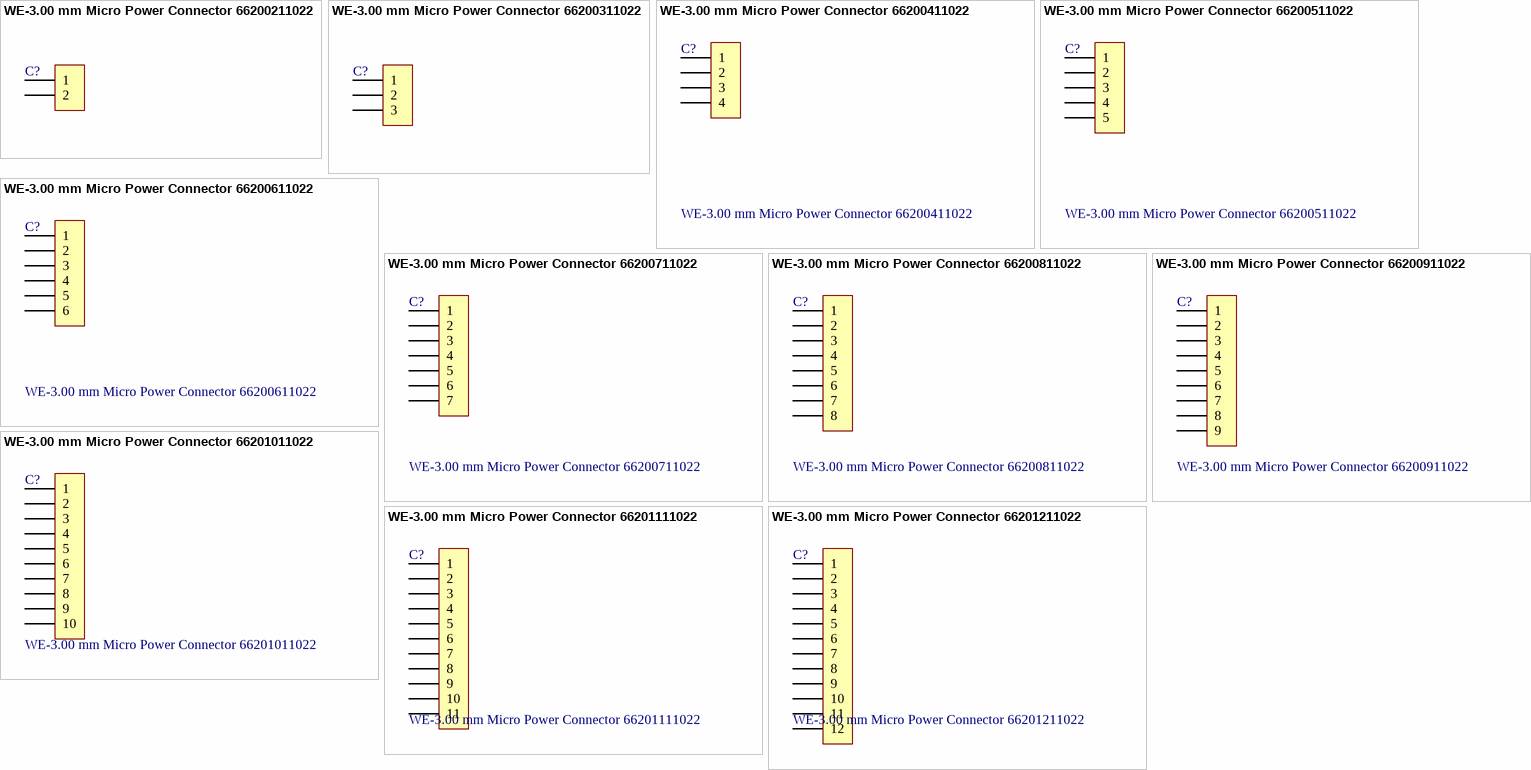
[diagram p7: symbols WE-3.00 mm Micro Power Connector 66200211022 to WE-3.00 mm Micro Power Connector 66201211022]

## WE-3.00 mm Micro Power Connector 66200211022
designator C?
WR-MPC3 3.00 mm Male Single Row Angled Header; Manufacturer: Würth Elektronik eiSos GmbH; ComponentLink1 Description: Manufacturer; ComponentLink2 Description: Datasheet; NoPins: 02; Created Date: 28 August 2013; partNo: 66200211022; ComponentLink1URL: http://www.we-online.com; ComponentLink2URL: http://katalog.we-online.de/em/datasheet/6620xx11022.pdf; Created by: Karrer Zheng
footprint 66200211022 (Single row Right angle header With plastic peg 02p)
pins: 1, 2

## WE-3.00 mm Micro Power Connector 66200311022
designator C?
WR-MPC3 3.00 mm Male Single Row Angled Header; Manufacturer: Würth Elektronik eiSos GmbH; ComponentLink1 Description: Manufacturer; ComponentLink2 Description: Datasheet; NoPins: 03; Created Date: 28 August 2013; partNo: 66200311022; ComponentLink1URL: http://www.we-online.com; ComponentLink2URL: http://katalog.we-online.de/em/datasheet/6620xx11022.pdf; Created by: Karrer Zheng
footprint 66200311022 (Single row Right angle header With plastic peg 03p)
pins: 1, 2, 3

## WE-3.00 mm Micro Power Connector 66200411022
designator C?
WR-MPC3 3.00 mm Male Single Row Angled Header; Manufacturer: Würth Elektronik eiSos GmbH; ComponentLink1 Description: Manufacturer; ComponentLink2 Description: Datasheet; NoPins: 04; Created Date: 28 August 2013; partNo: 66200411022; ComponentLink1URL: http://www.we-online.com; ComponentLink2URL: http://katalog.we-online.de/em/datasheet/6620xx11022.pdf; Created by: Karrer Zheng
footprint 66200411022 (Single row Right angle header With plastic peg 04p)
pins: 1, 2, 3, 4

## WE-3.00 mm Micro Power Connector 66200511022
designator C?
WR-MPC3 3.00 mm Male Single Row Angled Header; Manufacturer: Würth Elektronik eiSos GmbH; ComponentLink1 Description: Manufacturer; ComponentLink2 Description: Datasheet; NoPins: 05; Created Date: 28 August 2013; partNo: 66200511022; ComponentLink1URL: http://www.we-online.com; ComponentLink2URL: http://katalog.we-online.de/em/datasheet/6620xx11022.pdf; Created by: Karrer Zheng
footprint 66200511022 (Single row Right angle header With plastic peg 05p)
pins: 1, 2, 3, 4, 5

## WE-3.00 mm Micro Power Connector 66200611022
designator C?
WR-MPC3 3.00 mm Male Single Row Angled Header; Manufacturer: Würth Elektronik eiSos GmbH; ComponentLink1 Description: Manufacturer; ComponentLink2 Description: Datasheet; NoPins: 06; Created Date: 28 August 2013; partNo: 66200611022; ComponentLink1URL: http://www.we-online.com; ComponentLink2URL: http://katalog.we-online.de/em/datasheet/6620xx11022.pdf; Created by: Karrer Zheng
footprint 66200611022 (Single row Right angle header With plastic peg 06p)
pins: 1, 2, 3, 4, 5, 6

## WE-3.00 mm Micro Power Connector 66200711022
designator C?
WR-MPC3 3.00 mm Male Single Row Angled Header; Manufacturer: Würth Elektronik eiSos GmbH; ComponentLink1 Description: Manufacturer; ComponentLink2 Description: Datasheet; NoPins: 07; Created Date: 28 August 2013; partNo: 66200711022; ComponentLink1URL: http://www.we-online.com; ComponentLink2URL: http://katalog.we-online.de/em/datasheet/6620xx11022.pdf; Created by: Karrer Zheng
footprint 66200711022 (Single row Right angle header With plastic peg 07p)
pins: 1, 2, 3, 4, 5, 6, 7

## WE-3.00 mm Micro Power Connector 66200811022
designator C?
WR-MPC3 3.00 mm Male Single Row Angled Header; Manufacturer: Würth Elektronik eiSos GmbH; ComponentLink1 Description: Manufacturer; ComponentLink2 Description: Datasheet; NoPins: 08; Created Date: 28 August 2013; partNo: 66200811022; ComponentLink1URL: http://www.we-online.com; ComponentLink2URL: http://katalog.we-online.de/em/datasheet/6620xx11022.pdf; Created by: Karrer Zheng
footprint 66200811022 (Single row Right angle header With plastic peg 08p)
pins: 1, 2, 3, 4, 5, 6, 7, 8

## WE-3.00 mm Micro Power Connector 66200911022
designator C?
WR-MPC3 3.00 mm Male Single Row Angled Header; Manufacturer: Würth Elektronik eiSos GmbH; ComponentLink1 Description: Manufacturer; ComponentLink2 Description: Datasheet; NoPins: 09; Created Date: 28 August 2013; partNo: 66200911022; ComponentLink1URL: http://www.we-online.com; ComponentLink2URL: http://katalog.we-online.de/em/datasheet/6620xx11022.pdf; Created by: Karrer Zheng
footprint 66200911022 (Single row Right angle header With plastic peg 09p)
pins: 1, 2, 3, 4, 5, 6, 7, 8, 9

## WE-3.00 mm Micro Power Connector 66201011022
designator C?
WR-MPC3 3.00 mm Male Single Row Angled Header; Manufacturer: Würth Elektronik eiSos GmbH; ComponentLink1 Description: Manufacturer; ComponentLink2 Description: Datasheet; NoPins: 10; Created Date: 28 August 2013; partNo: 66201011022; ComponentLink1URL: http://www.we-online.com; ComponentLink2URL: http://katalog.we-online.de/em/datasheet/6620xx11022.pdf; Created by: Karrer Zheng
footprint 66201011022 (Single row Right angle header With plastic peg 10p)
pins: 1, 2, 3, 4, 5, 6, 7, 8, 9, 10
